# Altium footprint library Global Library.PcbLib: 97 footprints (part 4 of 7)
Each footprint in its own frame and in the unit in brackets; x right, y up, seen from the top. Pads: shape width x height; smd on the part's side, far side on the other; paste and mask are expansions set on the pad; w line width, h text height; cw(c..) or ccw(c..) is an arc to the next point about the centre after c.
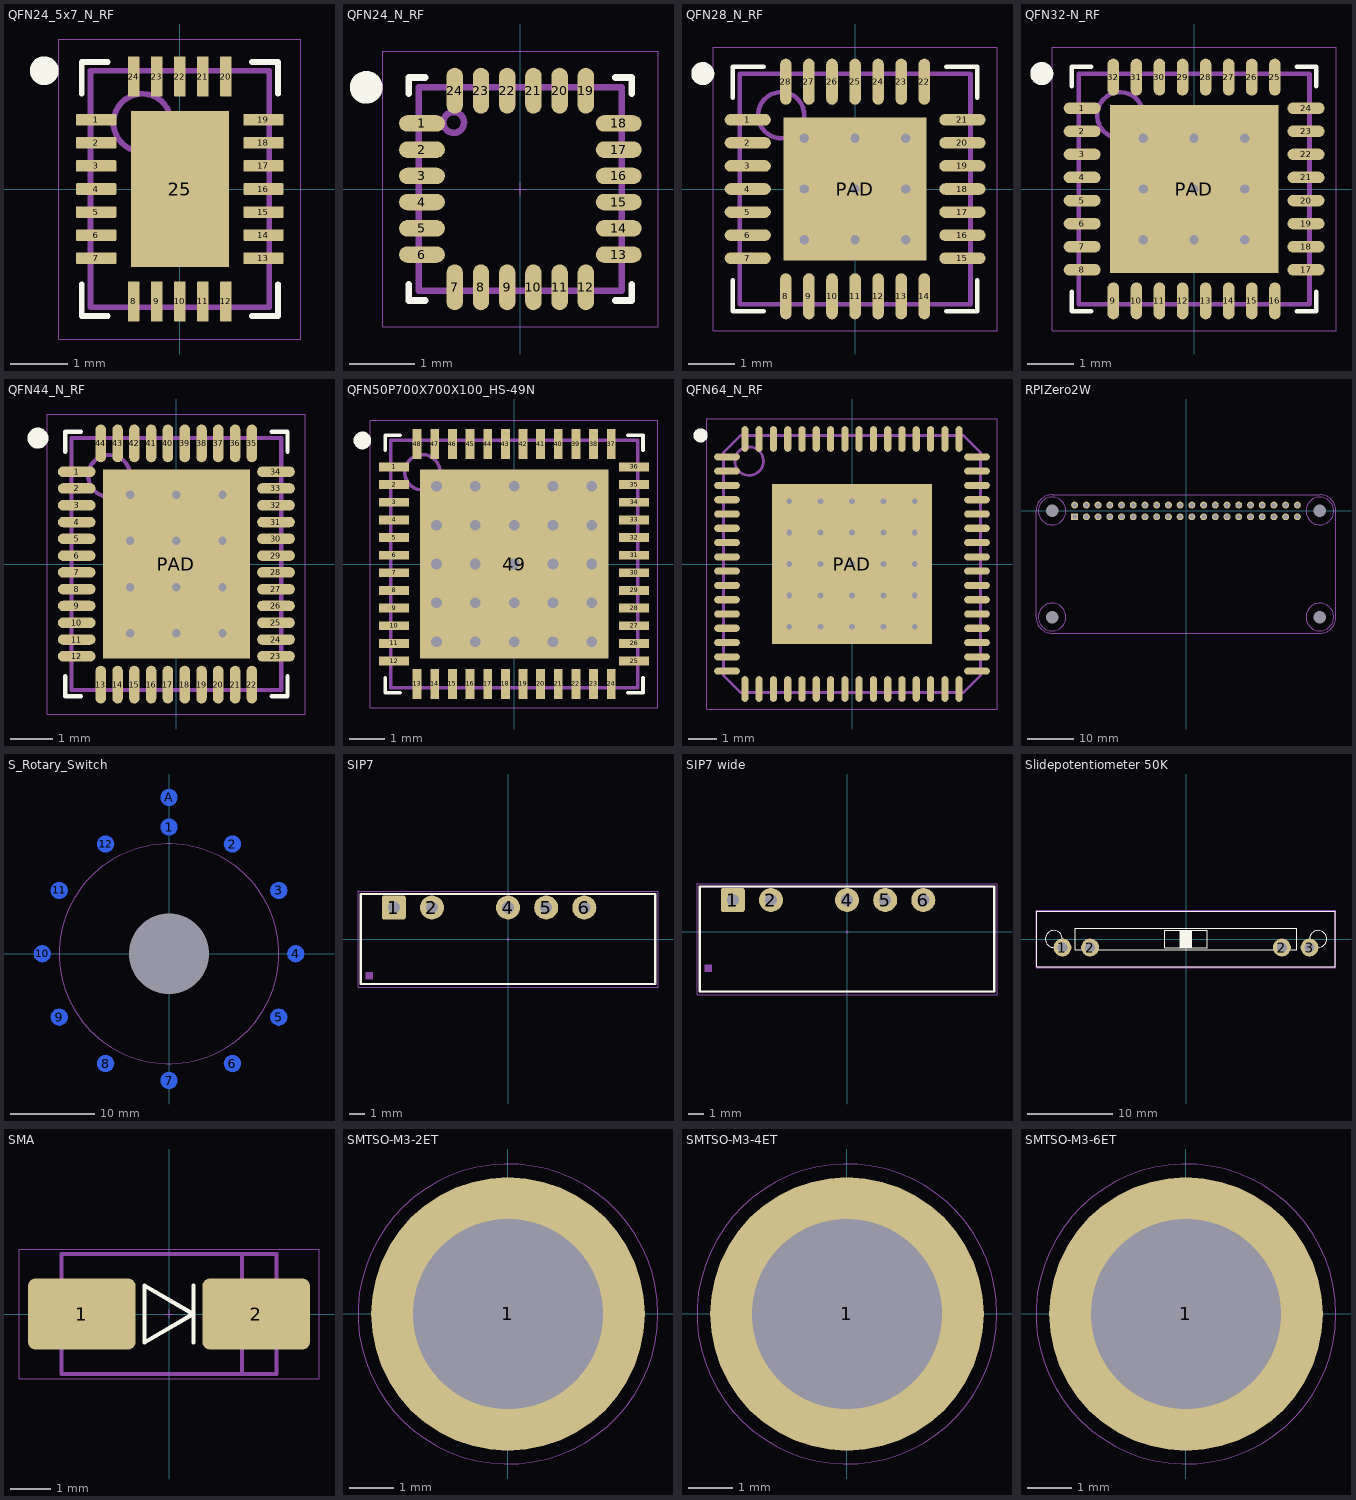
[diagram p3: the footprints below, top view; thin cyan lines are the x and y axes]

## QFN24_5x7_N_RF [mm] "QFN, 24-Leads, Body 3.00x4.00mm, Pitch 0.40mm, Thermal Pad 1.70x2.70mm, IPC Medium Density"
height 1
pads (25):
  rrect20% 0.7x0.2 smd: 1(-1.45,1.2) 2(-1.45,0.8) 3(-1.45,0.4) 4(-1.45,0) 5(-1.45,-0.4) 6(-1.45,-0.8) 7(-1.45,-1.2) 13(1.45,-1.2) 14(1.45,-0.8) 15(1.45,-0.4) 16(1.45,0) 17(1.45,0.4) 18(1.45,0.8) 19(1.45,1.2)
  rrect20% 0.2x0.7 smd: 8(-0.8,-1.95) 9(-0.4,-1.95) 10(0,-1.95) 11(0.4,-1.95) 12(0.8,-1.95) 20(0.8,1.95) 21(0.4,1.95) 22(0,1.95) 23(-0.4,1.95) 24(-0.8,1.95)
  rect 1.7x2.7 smd: 25(0,0)
Top Overlay:
  circle w0.25: c-2.35,2.05 r0.125
  lines w0.1: -1.7,-1.65 -1.7,-2.2 -1.25,-2.2 ; -1.7,1.65 -1.7,2.2 -1.25,2.2 ; 1.25,-2.2 1.7,-2.2 1.7,-1.65 ; 1.25,2.2 1.7,2.2 1.7,1.65
Top Courtyard:
  lines w0.01: -0.1,0 0.1,0 ; 0,-0.1 0,0.1 ; -2.1,-2.6 2.1,-2.6 2.1,2.6 -2.1,2.6 -2.1,-2.6
Top Assembly:
  circle w0.1: c-0.65,1.15 r0.5
  lines w0.1: -1.55,-2.05 1.55,-2.05 1.55,2.05 -1.55,2.05 -1.55,-2.05
Top Assy SMT:
  circle w0.1: c-0.65,1.15 r0.5
  lines w0.1: -1.55,-2.05 1.55,-2.05 1.55,2.05 -1.55,2.05 -1.55,-2.05
  text ".Designator" at -2.286,2.286 h1
3D body "QFN24_5x7_N_RF.step": height 1, standoff 0, extent -1.551,-2.051 1.551,2.051

## QFN24_N_RF [mm] "QFN, 24-Leads, Body 3.00x3.00mm, Pitch 0.40mm, Thermal Pad 1.70x1.54mm, IPC Medium Density"
height 1.05
pads (24):
  oval 0.7x0.25 smd mask+0.1: 1(-1.5,1) 2(-1.5,0.6) 3(-1.5,0.2) 4(-1.5,-0.2) 5(-1.5,-0.6) 6(-1.5,-1) 13(1.5,-1) 14(1.5,-0.6) 15(1.5,-0.2) 16(1.5,0.2) 17(1.5,0.6) 18(1.5,1)
  oval 0.25x0.7 smd mask+0.1: 7(-1,-1.5) 8(-0.6,-1.5) 9(-0.2,-1.5) 10(0.2,-1.5) 11(0.6,-1.5) 12(1,-1.5) 19(1,1.5) 20(0.6,1.5) 21(0.2,1.5) 22(-0.2,1.5) 23(-0.6,1.5) 24(-1,1.5)
Top Overlay:
  circle w0.25: c-2.35,1.55 r0.125
  lines w0.1: -1.7,-1.45 -1.7,-1.7 -1.45,-1.7 ; -1.7,1.45 -1.7,1.7 -1.45,1.7 ; 1.45,-1.7 1.7,-1.7 1.7,-1.45 ; 1.45,1.7 1.7,1.7 1.7,1.45
Top Courtyard:
  lines w0.01: -0.1,0 0.1,0 ; 0,-0.1 0,0.1 ; -2.1,-2.1 -2.1,2.1 2.1,2.1 2.1,-2.1 -2.1,-2.1
Top Assembly:
  circle w0.1: c-1.016,1.016 r0.158
  lines w0.1: -1.55,-1.55 -1.55,1.55 1.55,1.55 1.55,-1.55 -1.55,-1.55
Top Assy SMT:
  circle w0.1: c-1.016,1.016 r0.158
  lines w0.1: -1.55,-1.55 1.55,-1.55 1.55,1.55 -1.55,1.55 -1.55,-1.55
  text ".Designator" at -2.286,2.286 h1
3D body "QFN24_N_RF.step": height 1.05, standoff 0, extent -1.551,-1.551 1.551,1.551

## QFN28_N_RF [mm] "QFN, 28-Leads, Body 5.00x5.00mm, Pitch 0.50mm, Thermal Pad 3.10x3.10mm, IPC Medium Density"
height 0.9
pads (29):
  oval 1x0.25 smd: 1(-2.325,1.5) 2(-2.325,1) 3(-2.325,0.5) 4(-2.325,0) 5(-2.325,-0.5) 6(-2.325,-1) 7(-2.325,-1.5) 15(2.325,-1.5) 16(2.325,-1) 17(2.325,-0.5) 18(2.325,0) 19(2.325,0.5) 20(2.325,1) 21(2.325,1.5)
  oval 0.25x1 smd: 8(-1.5,-2.325) 9(-1,-2.325) 10(-0.5,-2.325) 11(0,-2.325) 12(0.5,-2.325) 13(1,-2.325) 14(1.5,-2.325) 22(1.5,2.325) 23(1,2.325) 24(0.5,2.325) 25(0,2.325) 26(-0.5,2.325) 27(-1,2.325) 28(-1.5,2.325)
  rect 3.1x3.1 smd: PAD(0,0)
via -1.1,1.1 diameter 0.5 hole 0.2
via 0,1.1 diameter 0.5 hole 0.2
via 1.1,1.1 diameter 0.5 hole 0.2
via -1.1,0 diameter 0.5 hole 0.2
via 0,0 diameter 0.5 hole 0.2
via 1.1,0 diameter 0.5 hole 0.2
via -1.1,-1.1 diameter 0.5 hole 0.2
via 0,-1.1 diameter 0.5 hole 0.2
via 1.1,-1.1 diameter 0.5 hole 0.2
Top Overlay:
  circle w0.25: c-3.3,2.5 r0.125
  lines w0.1: -2.65,-1.975 -2.65,-2.65 -1.975,-2.65 ; -2.65,1.975 -2.65,2.65 -1.975,2.65 ; 1.975,-2.65 2.65,-2.65 2.65,-1.975 ; 1.975,2.65 2.65,2.65 2.65,1.975
Top Courtyard:
  lines w0.01: -0.1,0 0.1,0 ; 0,-0.1 0,0.1 ; -3.075,-3.075 -3.075,3.075 3.075,3.075 3.075,-3.075 -3.075,-3.075
Top Assembly:
  circle w0.1: c-1.6,1.6 r0.5
  lines w0.1: -2.5,-2.5 -2.5,2.5 2.5,2.5 2.5,-2.5 -2.5,-2.5
Top Assy SMT:
  circle w0.1: c-1.6,1.6 r0.5
  lines w0.1: -2.5,-2.5 2.5,-2.5 2.5,2.5 -2.5,2.5 -2.5,-2.5
  text ".Designator" at -3,3.2 h1
3D body "QFN28_N_RF.step": height 0.9, standoff 0, extent -2.501,-2.501 2.501,2.501

## QFN32-N_RF [mm] "QFN, 32-Leads, Body 5.00x5.00mm, Pitch 0.50mm, Thermal Pad 3.65x3.65mm, IPC Medium Density"
height 0.9
pads (33):
  oval 0.8x0.25 smd: 1(-2.425,1.75) 2(-2.425,1.25) 3(-2.425,0.75) 4(-2.425,0.25) 5(-2.425,-0.25) 6(-2.425,-0.75) 7(-2.425,-1.25) 8(-2.425,-1.75) 17(2.425,-1.75) 18(2.425,-1.25) 19(2.425,-0.75) 20(2.425,-0.25) 21(2.425,0.25) 22(2.425,0.75) 23(2.425,1.25) 24(2.425,1.75)
  oval 0.25x0.8 smd: 9(-1.75,-2.425) 10(-1.25,-2.425) 11(-0.75,-2.425) 12(-0.25,-2.425) 13(0.25,-2.425) 14(0.75,-2.425) 15(1.25,-2.425) 16(1.75,-2.425) 25(1.75,2.425) 26(1.25,2.425) 27(0.75,2.425) 28(0.25,2.425) 29(-0.25,2.425) 30(-0.75,2.425) 31(-1.25,2.425) 32(-1.75,2.425)
  rect 3.65x3.65 smd: PAD(0,0)
via 1.1,-1.1 diameter 0.5 hole 0.2
via 0,-1.1 diameter 0.5 hole 0.2
via -1.1,-1.1 diameter 0.5 hole 0.2
via 1.1,0 diameter 0.5 hole 0.2
via 0,0 diameter 0.5 hole 0.2
via -1.1,0 diameter 0.5 hole 0.2
via 1.1,1.1 diameter 0.5 hole 0.2
via 0,1.1 diameter 0.5 hole 0.2
via -1.1,1.1 diameter 0.5 hole 0.2
Top Overlay:
  circle w0.25: c-3.3,2.5 r0.125
  lines w0.1: -2.65,-2.225 -2.65,-2.65 -2.225,-2.65 ; -2.65,2.225 -2.65,2.65 -2.225,2.65 ; 2.225,-2.65 2.65,-2.65 2.65,-2.225 ; 2.225,2.65 2.65,2.65 2.65,2.225
Top Courtyard:
  lines w0.01: -0.1,0 0.1,0 ; 0,-0.1 0,0.1 ; -3.075,-3.075 3.075,-3.075 3.075,3.075 -3.075,3.075 -3.075,-3.075
Top Assembly:
  circle w0.1: c-1.6,1.6 r0.5
  lines w0.1: -2.5,-2.5 2.5,-2.5 2.5,2.5 -2.5,2.5 -2.5,-2.5
Top Assy SMT:
  lines w0.1: -2.5,-2.5 2.5,-2.5 2.5,2.5 -2.5,2.5 -2.5,-2.5
  text ".Designator" at -3,3.2 h1
3D body "QFN32-N_RF.step": height 0.9, standoff 0, extent -2.501,-2.501 2.501,2.501

## QFN44_N_RF [mm] "QFN, 44-Leads, Body 5.00x6.00mm, Pitch 0.40mm, Thermal Pad 3.50x4.50mm, IPC Medium Density"
height 0.75
pads (45):
  oval 0.9x0.25 smd: 1(-2.375,2.2) 2(-2.375,1.8) 3(-2.375,1.4) 4(-2.375,1) 5(-2.375,0.6) 6(-2.375,0.2) 7(-2.375,-0.2) 8(-2.375,-0.6) 9(-2.375,-1) 10(-2.375,-1.4) 11(-2.375,-1.8) 12(-2.375,-2.2) 23(2.375,-2.2) 24(2.375,-1.8) 25(2.375,-1.4) 26(2.375,-1) 27(2.375,-0.6) 28(2.375,-0.2) 29(2.375,0.2) 30(2.375,0.6) 31(2.375,1) 32(2.375,1.4) 33(2.375,1.8) 34(2.375,2.2)
  oval 0.25x0.9 smd: 13(-1.8,-2.875) 14(-1.4,-2.875) 15(-1,-2.875) 16(-0.6,-2.875) 17(-0.2,-2.875) 18(0.2,-2.875) 19(0.6,-2.875) 20(1,-2.875) 21(1.4,-2.875) 22(1.8,-2.875) 35(1.8,2.875) 36(1.4,2.875) 37(1,2.875) 38(0.6,2.875) 39(0.2,2.875) 40(-0.2,2.875) 41(-0.6,2.875) 42(-1,2.875) 43(-1.4,2.875) 44(-1.8,2.875)
  rect 3.5x4.5 smd: PAD(0,0)
via 1.1,-1.65 diameter 0.5 hole 0.2
via 0,-1.65 diameter 0.5 hole 0.2
via -1.1,-1.65 diameter 0.5 hole 0.2
via 1.1,-0.55 diameter 0.5 hole 0.2
via 0,-0.55 diameter 0.5 hole 0.2
via -1.1,-0.55 diameter 0.5 hole 0.2
via 1.1,0.55 diameter 0.5 hole 0.2
via 0,0.55 diameter 0.5 hole 0.2
via -1.1,0.55 diameter 0.5 hole 0.2
via 1.1,1.65 diameter 0.5 hole 0.2
via 0,1.65 diameter 0.5 hole 0.2
via -1.1,1.65 diameter 0.5 hole 0.2
Top Overlay:
  circle w0.25: c-3.3,3 r0.125
  lines w0.1: -2.65,-2.675 -2.65,-3.15 -2.275,-3.15 ; -2.65,2.675 -2.65,3.15 -2.275,3.15 ; 2.275,-3.15 2.65,-3.15 2.65,-2.675 ; 2.275,3.15 2.65,3.15 2.65,2.675
Top Courtyard:
  lines w0.01: -0.1,0 0.1,0 ; 0,-0.1 0,0.1 ; -3.075,-3.575 3.075,-3.575 3.075,3.575 -3.075,3.575 -3.075,-3.575
Top Assembly:
  circle w0.1: c-1.6,2.1 r0.5
  lines w0.1: -2.5,-3 2.5,-3 2.5,3 -2.5,3 -2.5,-3
Top Assy SMT:
  lines w0.1: -2.5,-3 2.5,-3 2.5,3 -2.5,3 -2.5,-3
  text ".Designator" at -3,3.7 h1
3D body "QFN44_N_RF.step": height 0.75, standoff 0, extent -2.501,-3.001 2.501,3.001

## QFN50P700X700X100_HS-49N [mm] "QFN, 48-Leads, Body 7.00x7.00mm, Pitch 0.50mm, Thermal Pad 5.35x5.35mm, IPC Medium Density"
height 1
pads (49):
  rect 0.85x0.25 smd: 1(-3.4,2.75) 2(-3.4,2.25) 3(-3.4,1.75) 4(-3.4,1.25) 5(-3.4,0.75) 6(-3.4,0.25) 7(-3.4,-0.25) 8(-3.4,-0.75) 9(-3.4,-1.25) 10(-3.4,-1.75) 11(-3.4,-2.25) 12(-3.4,-2.75) 25(3.4,-2.75) 26(3.4,-2.25) 27(3.4,-1.75) 28(3.4,-1.25) 29(3.4,-0.75) 30(3.4,-0.25) 31(3.4,0.25) 32(3.4,0.75) 33(3.4,1.25) 34(3.4,1.75) 35(3.4,2.25) 36(3.4,2.75)
  rect 0.25x0.85 smd: 13(-2.75,-3.4) 14(-2.25,-3.4) 15(-1.75,-3.4) 16(-1.25,-3.4) 17(-0.75,-3.4) 18(-0.25,-3.4) 19(0.25,-3.4) 20(0.75,-3.4) 21(1.25,-3.4) 22(1.75,-3.4) 23(2.25,-3.4) 24(2.75,-3.4) 37(2.75,3.4) 38(2.25,3.4) 39(1.75,3.4) 40(1.25,3.4) 41(0.75,3.4) 42(0.25,3.4) 43(-0.25,3.4) 44(-0.75,3.4) 45(-1.25,3.4) 46(-1.75,3.4) 47(-2.25,3.4) 48(-2.75,3.4)
  rect 5.35x5.35 smd: 49(0,0)
via 2.2,-2.2 diameter 0.65 hole 0.3
via 1.1,-2.2 diameter 0.65 hole 0.3
via 0,-2.2 diameter 0.65 hole 0.3
via -1.1,-2.2 diameter 0.65 hole 0.3
via -2.2,-2.2 diameter 0.65 hole 0.3
via 2.2,-1.1 diameter 0.65 hole 0.3
via 1.1,-1.1 diameter 0.65 hole 0.3
via 0,-1.1 diameter 0.65 hole 0.3
via -1.1,-1.1 diameter 0.65 hole 0.3
via -2.2,-1.1 diameter 0.65 hole 0.3
via 2.2,0 diameter 0.65 hole 0.3
via 1.1,0 diameter 0.65 hole 0.3
via 0,0 diameter 0.65 hole 0.3
via -1.1,0 diameter 0.65 hole 0.3
via -2.2,0 diameter 0.65 hole 0.3
via 2.2,1.1 diameter 0.65 hole 0.3
via 1.1,1.1 diameter 0.65 hole 0.3
via 0,1.1 diameter 0.65 hole 0.3
via -1.1,1.1 diameter 0.65 hole 0.3
via -2.2,1.1 diameter 0.65 hole 0.3
via 2.2,2.2 diameter 0.65 hole 0.3
via 1.1,2.2 diameter 0.65 hole 0.3
via 0,2.2 diameter 0.65 hole 0.3
via -1.1,2.2 diameter 0.65 hole 0.3
via -2.2,2.2 diameter 0.65 hole 0.3
Top Overlay:
  circle w0.25: c-4.3,3.5 r0.125
  lines w0.1: -3.65,-3.225 -3.65,-3.65 -3.225,-3.65 ; -3.65,3.225 -3.65,3.65 -3.225,3.65 ; 3.225,-3.65 3.65,-3.65 3.65,-3.225 ; 3.225,3.65 3.65,3.65 3.65,3.225
Top Courtyard:
  lines w0.01: -4.075,-4.075 4.075,-4.075 4.075,4.075 -4.075,4.075 -4.075,-4.075
  lines w0.1: -0.5,0 0.5,0 ; 0,-0.5 0,0.5
Top Assembly:
  circle w0.1: c-2.6,2.6 r0.5
  lines w0.1: -3.5,-3.5 3.5,-3.5 3.5,3.5 -3.5,3.5 -3.5,-3.5
Top Assy SMT:
  circle w0.1: c-2.6,2.6 r0.5
  lines w0.1: -3.5,-3.5 3.5,-3.5 3.5,3.5 -3.5,3.5 -3.5,-3.5
  text ".Designator" at -2.413,-0.221 h1
3D body "QFN50P700X700X100_HS-49N.step": height 1, standoff 0, extent -3.501,-3.501 3.501,3.501

## QFN64_N_RF [mm] "QFN, 64-Leads, Body 9.00x9.00mm, Pitch 0.50mm, Thermal Pad 5.60x5.60mm, IPC Medium Density"
height 1
pads (65):
  oval 0.9x0.25 smd: 1(-4.375,3.75) 2(-4.375,3.25) 3(-4.375,2.75) 4(-4.375,2.25) 5(-4.375,1.75) 6(-4.375,1.25) 7(-4.375,0.75) 8(-4.375,0.25) 9(-4.375,-0.25) 10(-4.375,-0.75) 11(-4.375,-1.25) 12(-4.375,-1.75) 13(-4.375,-2.25) 14(-4.375,-2.75) 15(-4.375,-3.25) 16(-4.375,-3.75) 33(4.375,-3.75) 34(4.375,-3.25) 35(4.375,-2.75) 36(4.375,-2.25) 37(4.375,-1.75) 38(4.375,-1.25) 39(4.375,-0.75) 40(4.375,-0.25) 41(4.375,0.25) 42(4.375,0.75) 43(4.375,1.25) 44(4.375,1.75) 45(4.375,2.25) 46(4.375,2.75) 47(4.375,3.25) 48(4.375,3.75)
  oval 0.25x0.9 smd: 17(-3.75,-4.375) 18(-3.25,-4.375) 19(-2.75,-4.375) 20(-2.25,-4.375) 21(-1.75,-4.375) 22(-1.25,-4.375) 23(-0.75,-4.375) 24(-0.25,-4.375) 25(0.25,-4.375) 26(0.75,-4.375) 27(1.25,-4.375) 28(1.75,-4.375) 29(2.25,-4.375) 30(2.75,-4.375) 31(3.25,-4.375) 32(3.75,-4.375) 49(3.75,4.375) 50(3.25,4.375) 51(2.75,4.375) 52(2.25,4.375) 53(1.75,4.375) 54(1.25,4.375) 55(0.75,4.375) 56(0.25,4.375) 57(-0.25,4.375) 58(-0.75,4.375) 59(-1.25,4.375) 60(-1.75,4.375) 61(-2.25,4.375) 62(-2.75,4.375) 63(-3.25,4.375) 64(-3.75,4.375)
  rect 5.6x5.6 smd: PAD(0,0)
via -2.2,2.2 diameter 0.5 hole 0.2
via -1.1,2.2 diameter 0.5 hole 0.2
via 0,2.2 diameter 0.5 hole 0.2
via 1.1,2.2 diameter 0.5 hole 0.2
via 2.2,2.2 diameter 0.5 hole 0.2
via -2.2,1.1 diameter 0.5 hole 0.2
via -1.1,1.1 diameter 0.5 hole 0.2
via 0,1.1 diameter 0.5 hole 0.2
via 1.1,1.1 diameter 0.5 hole 0.2
via 2.2,1.1 diameter 0.5 hole 0.2
via -2.2,0 diameter 0.5 hole 0.2
via -1.1,0 diameter 0.5 hole 0.2
via 0,0 diameter 0.5 hole 0.2
via 1.1,0 diameter 0.5 hole 0.2
via 2.2,0 diameter 0.5 hole 0.2
via -2.2,-1.1 diameter 0.5 hole 0.2
via -1.1,-1.1 diameter 0.5 hole 0.2
via 0,-1.1 diameter 0.5 hole 0.2
via 1.1,-1.1 diameter 0.5 hole 0.2
via 2.2,-1.1 diameter 0.5 hole 0.2
via -2.2,-2.2 diameter 0.5 hole 0.2
via -1.1,-2.2 diameter 0.5 hole 0.2
via 0,-2.2 diameter 0.5 hole 0.2
via 1.1,-2.2 diameter 0.5 hole 0.2
via 2.2,-2.2 diameter 0.5 hole 0.2
Top Overlay:
  circle w0.25: c-5.3,4.5 r0.125
Top Courtyard:
  lines w0.01: -0.1,0 0.1,0 ; 0,-0.1 0,0.1 ; -5.075,-5.075 -5.075,5.075 5.075,5.075 5.075,-5.075 -5.075,-5.075
Top Assembly:
  circle w0.1: c-3.6,3.6 r0.5
  lines w0.1: -4.5,-3.9 -3.9,-4.5 3.9,-4.5 4.5,-3.9 4.5,3.9 3.9,4.5 -3.9,4.5 -4.5,3.9 -4.5,-3.9
Top Assy SMT:
  circle w0.1: c-3.6,3.6 r0.5
  lines w0.1: -4.5,-3.9 -3.9,-4.5 3.9,-4.5 4.5,-3.9 4.5,3.9 3.9,4.5 -3.9,4.5 -4.5,3.9 -4.5,-3.9
  text ".Designator" at -4.4,5.2 h1
3D body "QFN64_N_RF.step": height 1, standoff 0, extent -4.501,-4.501 4.501,4.501

## RPIZero2W [mm]
pads (44):
  round 0 hole 2.7 unplated: 0(-29,-23) 0(-29,0) 0(29,-23) 0(29,0)
  rrect20% 1.5x1.5 hole 1: 1(-24.13,-1.27)
  round 1.5 hole 1: 2(-24.13,1.27) 3(-21.59,-1.27) 4(-21.59,1.27) 5(-19.05,-1.27) 6(-19.05,1.27) 7(-16.51,-1.27) 8(-16.51,1.27) 9(-13.97,-1.27) 10(-13.97,1.27) 11(-11.43,-1.27) 12(-11.43,1.27) 13(-8.89,-1.27) 14(-8.89,1.27) 15(-6.35,-1.27) 16(-6.35,1.27) 17(-3.81,-1.27) 18(-3.81,1.27) 19(-1.27,-1.27) 20(-1.27,1.27) 21(1.27,-1.27) 22(1.27,1.27) 23(3.81,-1.27) 24(3.81,1.27) 25(6.35,-1.27) 26(6.35,1.27) 27(8.89,-1.27) 28(8.89,1.27) 29(11.43,-1.27) 30(11.43,1.27) 31(13.97,-1.27) 32(13.97,1.27) 33(16.51,-1.27) 34(16.51,1.27) 35(19.05,-1.27) 36(19.05,1.27) 37(21.59,-1.27) 38(21.59,1.27) 39(24.13,-1.27) 40(24.13,1.27)
Top Assembly:
  circle w0.1: c-29,0 r3
  circle w0.1: c-29,-23 r3
  circle w0.1: c29,-23 r3
  circle w0.1: c29,0 r3
  lines w0.1: -32.5,-23 ccw(c-29,-23) -29,-26.5 29,-26.5 ccw(c29,-23) 32.5,-23 32.5,0 ccw(c29,0) 29,3.5 -29,3.5 ccw(c-29,0) -32.5,0 -32.5,-23
Top Assy THT:
  circle w0.1: c29,-23 r3
  circle w0.1: c29,0 r3
  circle w0.1: c-29,0 r3
  circle w0.1: c-29,-23 r3
  lines w0.1: -32.5,-23 ccw(c-29,-23) -29,-26.5 29,-26.5 ccw(c29,-23) 32.5,-23 32.5,0 ccw(c29,0) 29,3.5 -29,3.5 ccw(c-29,0) -32.5,0 -32.5,-23
  text ".Designator" at -29,4 h2
3D body "Raspberry Pi Zero 2 W.STEP": height 8.25, standoff 3.2, extent -32.4,-27 33.4,3.576

## S_Rotary_Switch [mm]
pads (14):
  round 2 smd far side: 1(0,15) 2(7.5,12.99) 3(12.99,7.5) 4(15,0) 5(12.99,-7.5) 6(7.5,-12.99) 7(0,-15) 8(-7.5,-12.99) 9(-12.99,-7.5) 10(-15,0) 11(-12.99,7.5) 12(-7.5,12.99) A(0,18.5)
  round 0 hole 9.5 unplated: 8(0,0)
Bottom Assembly:
  circle w0.1: c0,0 r13

## SIP7 [mm] "7 PIN SIP Package"
height 10.16
pads (5):
  rrect20% 1.6x1.6 hole 0.8: 1(-7.615,2.1)
  round 1.6 hole 0.8: 2(-5.075,2.1) 4(0.005,2.1) 5(2.545,2.1) 6(5.085,2.1)
Top Overlay:
  lines w0.15: -9.825,-3 9.825,-3 9.825,3 -9.825,3 -9.825,-3
Top Courtyard:
  lines w0.01: -10,3.2 10,3.2 10,-3.2 -10,-3.2 -10,3.204 ; -0.1,0 0.1,0 ; 0,-0.1 0,0.1
Top Assembly:
  rectangle: -9.5,-2.7 -9,-2.2
  lines w0.1: -9.825,-3 9.825,-3 9.825,3 -9.825,3 -9.825,-3
Top Assy THT:
  rectangle: -9.5,-2.7 -9,-2.2
  lines w0.1: -9.825,-3 9.825,-3 9.825,3 -9.825,3 -9.825,-3
  text ".Designator" at -5.483,3.46 h1.52
3D body "CUI_PDME1-S5-S3-S.step": height 10.16, standoff -4.1, extent -9.825,-3 9.825,3

## SIP7 wide [mm] "7 PIN SIP Package"
height 10.16
pads (5):
  rrect20% 1.6x1.6 hole 0.8: 1(-7.615,2.1)
  round 1.6 hole 0.8: 2(-5.075,2.1) 4(0.005,2.1) 5(2.545,2.1) 6(5.085,2.1)
Top Overlay:
  lines w0.15: -9.825,-4 9.825,-4 9.825,3 -9.825,3 -9.825,-4
Top Courtyard:
  lines w0.01: -10,3.2 10,3.2 10,-4.2 -10,-4.2 -10,3.204 ; -0.1,0 0.1,0 ; 0,-0.1 0,0.1
Top Assembly:
  rectangle: -9.5,-2.7 -9,-2.2
  lines w0.1: -9.825,-4 9.825,-4 9.825,3 -9.825,3 -9.825,-4
Top Assy THT:
  rectangle: -9.5,-2.7 -9,-2.2
  lines w0.1: -9.825,-4 9.825,-4 9.825,3 -9.825,3 -9.825,-4
  text ".Designator" at -5.483,3.46 h1.52
3D body "CUI_PDME1-S5-S3-S.step": height 10.16, standoff -4.1, extent -9.825,-3 9.825,3

## Slidepotentiometer 50K [mm]
pads (4):
  round 2.1 hole 1.2: 1(-14.5,-1) 2(-11.25,-1) 2(11.25,-1) 3(14.5,-1)
Top Overlay:
  circle w0.1: c-15.5,0 r1
  circle w0.1: c15.5,0 r1
  rectangle: -0.7,-1 0.7,1
  lines w0.1: -0.7,-1 -0.7,1 ; 0.7,-1 0.7,1 ; -17.5,-3.25 17.5,-3.25 17.5,3.25 -17.5,3.25 -17.5,-3.25 ; -13,-1.25 13,-1.25 13,1.25 -13,1.25 -13,-1.25 ; -2.5,-1 -2.5,1 2.5,1 2.5,-1 -2.5,-1
Top Courtyard:
  lines w0.01: -0.1,0 0.1,0 ; 0,-0.1 0,0.1 ; -17.6,-3.4 17.6,-3.4 17.6,3.4 -17.6,3.4 -17.6,-3.4
Top Assembly:
  lines w0.1: -17.5,-3.25 17.5,-3.25 17.5,3.25 -17.5,3.25 -17.5,-3.25
Top Assy SMT:
  lines w0.1: -17.5,-3.25 -17.5,3.25 17.5,3.25 17.5,-3.25 -17.5,-3.25
Top Assy THT:
  text ".Designator" at -17.335,3.575 h1
3D body "Slidepotentiometer B50K.stp": height 19.38, standoff -4, extent -17.5,-3.25 17.5,3.25

## SMA [mm] "Diode Package"
pads (2):
  rrect20% 2.65x1.75 smd: 1(-2.15,0) 2(2.15,0)
Top Overlay:
  lines w0.1: 0.6,-0.7 0.6,0.7 ; -0.6,-0.7 0.6,0 -0.6,0.7 -0.6,-0.7
Top Courtyard:
  lines w0.01: -0.1,0 0.1,0 ; 0,-0.1 0,0.1 ; -3.7,-1.6 -3.7,1.6 3.7,1.6 3.7,-1.6 -3.7,-1.6
Top Assembly:
  lines w0.1: 1.8,-1.475 1.8,1.475 ; -2.65,-1.475 -2.65,1.475 2.65,1.475 2.65,-1.475 -2.65,-1.475
Top Assy SMT:
  lines w0.1: 1.8,-1.475 1.8,1.475 ; -2.65,-1.475 -2.65,1.475 2.65,1.475 2.65,-1.475 -2.65,-1.475
  text ".Designator" at -2.675,1.725 h1
3D body "Diode SMA.stp": height 2.41, standoff 0, extent -2.64,-1.46 2.64,1.46

## SMTSO-M3-2ET [mm]
pads (1):
  round 6.2 hole 4.3: 1(0,0)
Top Courtyard:
  circle w0.01: c0,0 r3.4
  lines w0.01: -0.1,0 0.1,0 ; 0,-0.1 0,0.1
Top Assembly:
  circle w0.1: c0,0 r2.1
Top Assy THT:
  circle w0.1: c0,0 r2.1
  text ".Designator" at -2.375,2.625 h1
3D body "SMTSO-M3-2ET-PennEngineering-3D-08-24-2024.stp": height 2, standoff -1.53, extent -2.78,-2.768 2.78,2.768

## SMTSO-M3-4ET [mm]
pads (1):
  round 6.2 hole 4.3: 1(0,0)
Top Courtyard:
  circle w0.01: c0,0 r3.4
  lines w0.01: -0.1,0 0.1,0 ; 0,-0.1 0,0.1
Top Assembly:
  circle w0.1: c0,0 r2.1
Top Assy THT:
  circle w0.1: c0,0 r2.1
  text ".Designator" at -2.375,2.625 h1
3D body "SMTSO-M3-4ET-PennEngineering-3D-08-24-2024.stp": height 4, standoff -1.53, extent -2.78,-2.768 2.78,2.768

## SMTSO-M3-6ET [mm]
pads (1):
  round 6.2 hole 4.3: 1(0,0)
Top Courtyard:
  circle w0.01: c0,0 r3.4
  lines w0.01: -0.1,0 0.1,0 ; 0,-0.1 0,0.1
Top Assembly:
  circle w0.1: c0,0 r2.1
Top Assy THT:
  circle w0.1: c0,0 r2.1
  text ".Designator" at -2.375,2.625 h1
3D body "SMTSO-M3-6ET-PennEngineering-3D-08-24-2024.stp": height 6, standoff -1.53, extent -2.78,-2.768 2.78,2.768